# Altium footprint library wilamp_st_v1p00.PcbLib: 52 footprints (part 2 of 4)
Each footprint in its own frame and in the unit in brackets; x right, y up, seen from the top. Pads: shape width x height; smd on the part's side, far side on the other; paste and mask are expansions set on the pad; w line width, h text height; cw(c..) or ccw(c..) is an arc to the next point about the centre after c.
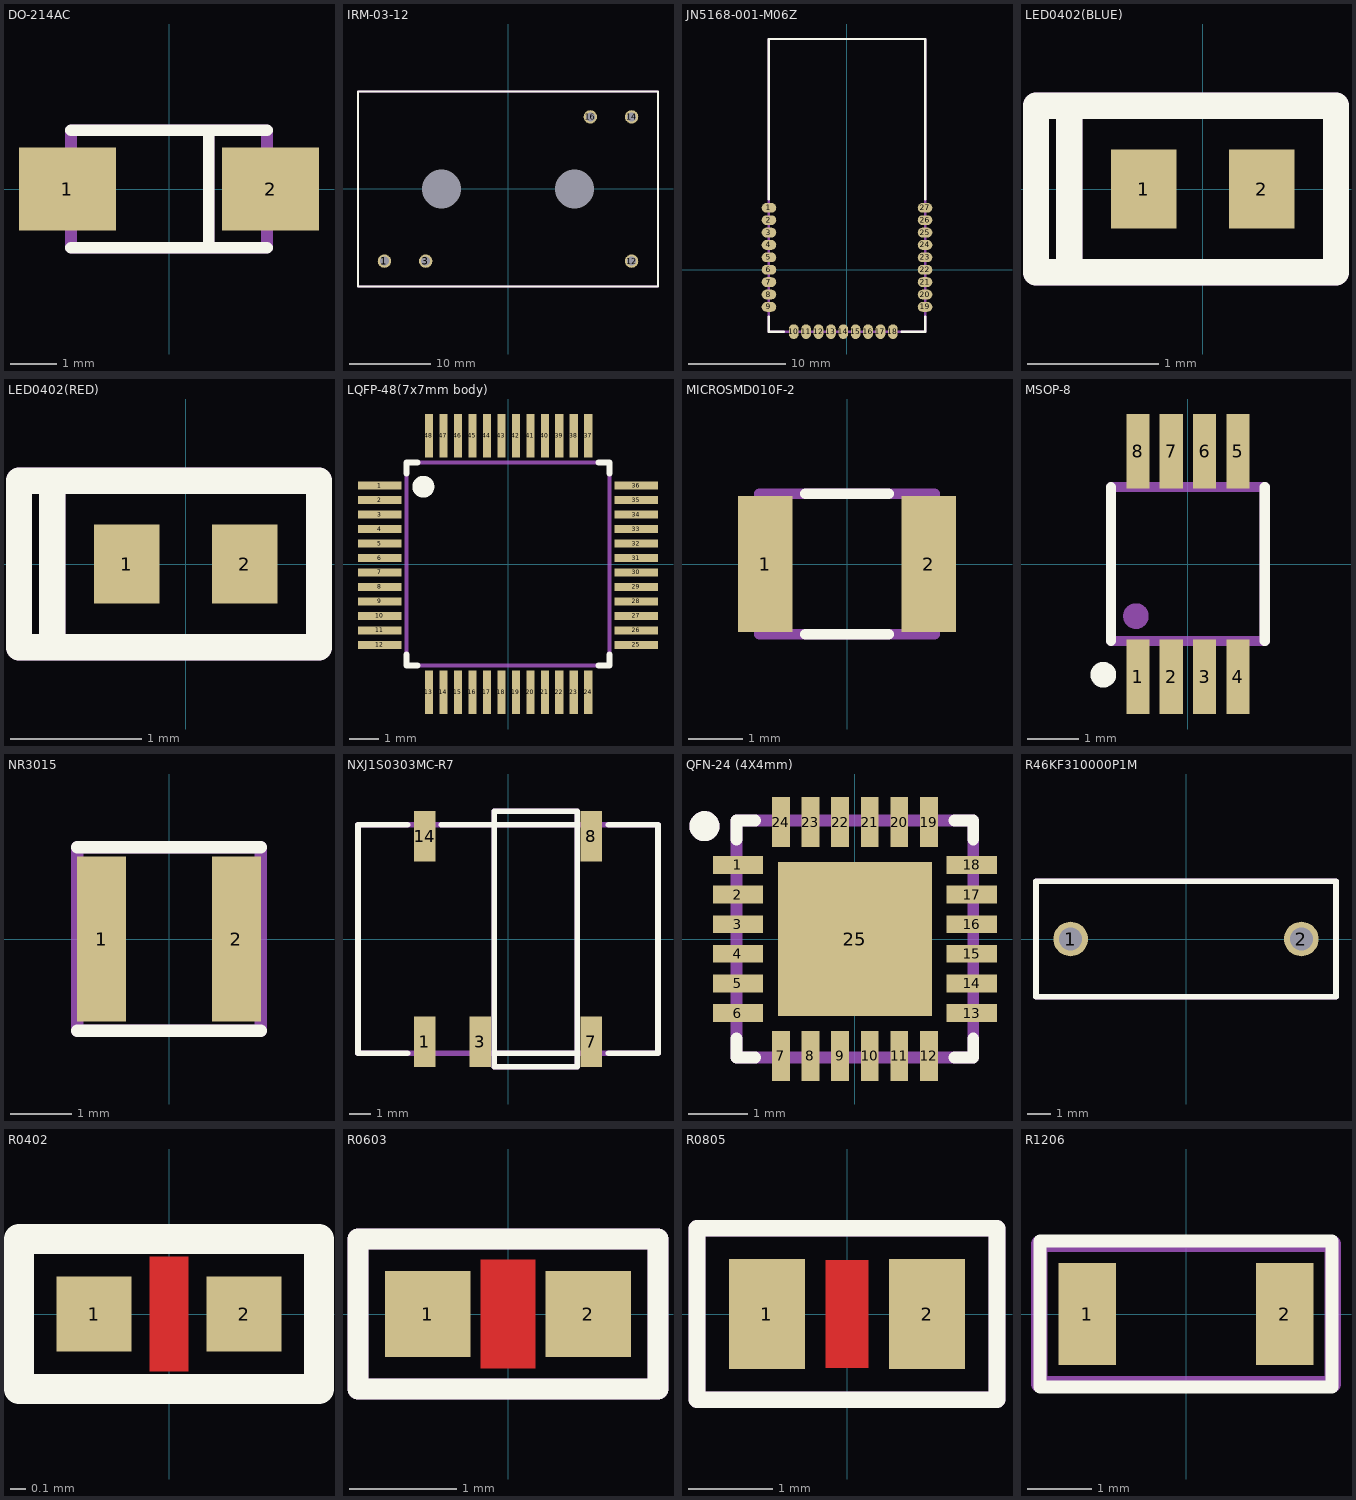
[diagram p1: the footprints below, top view; thin cyan lines are the x and y axes]

## DO-214AC [mm]
pads (2):
  rect 2.1x1.8 smd: 1(-2.2,0) 2(2.2,0)
Top Overlay:
  lines w0.254: -2.125,-1.27 2.125,-1.27 ; -2.125,1.27 2.125,1.27 ; 0.864,-1.252 0.864,1.25
Mechanical 16:
  lines w0.254: -2.125,-1.27 2.125,-1.27 2.125,1.27 -2.125,1.27 -2.125,-1.232 ; 0.864,-1.252 0.864,1.25
Mechanical 29:
  text ".Designator" at 0.191,0.531 h1
3D body "SW3dPS-DO-214AC SMA.STEP": height 2.4, standoff 0, extent -2.651,-1.321 2.549,1.279

## IRM-03-12 [mm]
pads (7):
  round 1.65 hole 1.1: 1(-15.24,-8.89) 3(-10.16,-8.89) 12(15.24,-8.89) 14(15.24,8.89) 16(10.16,8.89)
  round 0 hole 4.8 unplated: Hole(-8.22,0) Hole(8.22,0)
Top Overlay:
  lines w0.254: -18.5,-12 -18.5,12 18.5,12 18.5,-12 -18.5,-12
Mechanical 16:
  lines w0.254: -18.5,-12 -18.5,12 18.5,12 18.5,-12 -18.5,-12
Mechanical 29:
  text ".Designator" at 0.404,-5.89 h3
3D body: height 15, standoff 0, extent -18.5,-12 18.5,12

## JN5168-001-M06Z [mm]
pads (27):
  oval 1.5x1 smd: 1(-8,6.35) 2(-8,5.08) 3(-8,3.81) 4(-8,2.54) 5(-8,1.27) 6(-8,0) 7(-8,-1.27) 8(-8,-2.54) 9(-8,-3.81) 19(8,-3.81) 20(8,-2.54) 21(8,-1.27) 22(8,0) 23(8,1.27) 24(8,2.54) 25(8,3.81) 26(8,5.08) 27(8,6.35)
  oval 1x1.5 smd: 10(-5.46,-6.35) 11(-4.19,-6.35) 12(-2.92,-6.35) 13(-1.65,-6.35) 14(-0.38,-6.35) 15(0.89,-6.35) 16(2.16,-6.35) 17(3.43,-6.35) 18(4.7,-6.35)
Top Overlay:
  lines w0.254: -8,-4.827 -8,-6.35 -6.477,-6.35 ; -8,7.24 -8,23.65 8,23.65 8,7.24 ; 5.588,-6.35 8,-6.35 8,-4.827
Mechanical 16:
  lines w0.254: -8,-6.35 8,-6.35 8,23.65 -8,23.65 -8,-6.35
Mechanical 29:
  text ".Designator" at 0.705,5.946 h1.52
3D body: height 3.5, standoff 0, extent -8,-6.35 8,23.65

## LED0402(BLUE) [mm]
pads (2):
  rect 0.5x0.6 smd: 1(-0.45,0) 2(0.45,0)
Top Overlay:
  lines w0.2: -1.016,-0.635 -1.27,-0.635 -1.27,0.635 -1.016,0.635 ; -1.016,-0.635 -1.016,0.635 ; -1.016,-0.635 1.016,-0.635 1.016,0.635 -1.016,0.635
Mechanical 16:
  lines w0.2: -1.016,-0.635 -1.27,-0.635 -1.27,0.635 -1.016,0.635 ; -1.016,-0.635 -1.016,0.635 ; -1.016,-0.635 1.016,-0.635 1.016,0.635 -1.016,0.635
Mechanical 29:
  text ".Designator" at 0.58,0.232 h0.5
3D body "User Library-LED_1006_B.STEP": height 0.2, standoff 0, extent -0.5,-0.3 0.5,0.3

## LED0402(RED) [mm]
pads (2):
  rect 0.5x0.6 smd: 1(-0.45,0) 2(0.45,0)
Top Overlay:
  lines w0.2: -1.016,-0.635 1.016,-0.635 1.016,0.635 -1.016,0.635 ; -1.016,-0.635 -1.016,0.635 ; -1.016,-0.635 -1.27,-0.635 -1.27,0.635 -1.016,0.635
Mechanical 16:
  lines w0.2: -1.016,-0.635 1.016,-0.635 1.016,0.635 -1.016,0.635 ; -1.016,-0.635 -1.016,0.635 ; -1.016,-0.635 -1.27,-0.635 -1.27,0.635 -1.016,0.635
Mechanical 29:
  text ".Designator" at -0.635,-0.254 h0.5
3D body "User Library-led_0402.step": height 0.45, standoff 0, extent -0.505,-0.25 0.505,0.25

## LQFP-48(7x7mm body) [mm]
pads (48):
  rect 1.5x0.28 smd: 1(-4.425,2.707) 2(-4.425,2.207) 3(-4.425,1.707) 4(-4.425,1.207) 5(-4.425,0.707) 6(-4.425,0.207) 7(-4.425,-0.293) 8(-4.425,-0.793) 9(-4.425,-1.293) 10(-4.425,-1.793) 11(-4.425,-2.293) 12(-4.425,-2.793) 25(4.425,-2.793) 26(4.425,-2.293) 27(4.425,-1.793) 28(4.425,-1.293) 29(4.425,-0.793) 30(4.425,-0.293) 31(4.425,0.207) 32(4.425,0.707) 33(4.425,1.207) 34(4.425,1.707) 35(4.425,2.207) 36(4.425,2.707)
  rect 0.28x1.5 smd: 13(-2.73,-4.425) 14(-2.23,-4.425) 15(-1.73,-4.425) 16(-1.23,-4.425) 17(-0.73,-4.425) 18(-0.23,-4.425) 19(0.27,-4.425) 20(0.77,-4.425) 21(1.27,-4.425) 22(1.77,-4.425) 23(2.27,-4.425) 24(2.77,-4.425) 37(2.77,4.425) 38(2.27,4.425) 39(1.77,4.425) 40(1.27,4.425) 41(0.77,4.425) 42(0.27,4.425) 43(-0.23,4.425) 44(-0.73,4.425) 45(-1.23,4.425) 46(-1.73,4.425) 47(-2.23,4.425) 48(-2.73,4.425)
Top Overlay:
  circle w0.5: c-2.921,2.667 r0.127
  lines w0.2: -3.5,-3.119 -3.5,-3.5 -3.119,-3.5 ; -3.5,3.119 -3.5,3.5 -3.119,3.5 ; 3.119,-3.5 3.5,-3.5 3.5,-3.119 ; 3.119,3.5 3.5,3.5 3.5,3.119
Mechanical 16:
  lines w0.15: -3.5,-3.5 3.5,-3.5 ; -3.5,-3.5 -3.5,3.5 ; -3.5,-3.5 3.5,-3.5 ; -3.5,-3.5 -3.5,3.5 ; -3.5,3.5 3.5,3.5 ; -3.5,3.5 3.5,3.5 ; 3.5,-3.5 3.5,3.5 ; 3.5,-3.5 3.5,3.5
Mechanical 29:
  text ".Designator" at -0.454,0.404 h0.6
3D body "User Library-LQFP48.step": height 1.5, standoff 0, extent -4.5,-4.5 4.5,4.5

## MICROSMD010F-2 [mm]
pads (2):
  rect 1x2.5 smd: 1(-1.5,0) 2(1.5,0)
Top Overlay:
  lines w0.2: -0.762,-1.288 0.762,-1.288 ; -0.762,1.288 0.762,1.288
Mechanical 16:
  lines w0.2: -1.607,-1.288 -1.607,1.288 1.607,1.288 1.607,-1.288 -1.607,-1.288
Mechanical 29:
  text ".Designator" at 0.353,-0.978 h0.46
3D body: height 0.67, standoff 0, extent -1.607,-1.288 1.607,1.288

## MSOP-8 [mm]
pads (8):
  rect 0.45x1.45 smd: 1(-0.975,-2.2) 2(-0.325,-2.2) 3(0.325,-2.2) 4(0.975,-2.2) 5(0.975,2.2) 6(0.325,2.2) 7(-0.325,2.2) 8(-0.975,2.2)
Top Overlay:
  circle w0.25: c-1.649,-2.159 r0.125
  lines w0.2: -1.5,-1.5 -1.5,1.5 ; 1.5,-1.5 1.5,1.5
Mechanical 16:
  circle w0.25: c-1.014,-1.016 r0.125
  lines w0.2: -1.5,-1.5 1.5,-1.5 1.5,1.5 -1.5,1.5 -1.5,-1.5
Mechanical 29:
  text ".Designator" at 0.427,-0.876 h0.51
3D body "MSOP-8.STEP": height 1.15, standoff 0, extent -1.523,-2.419 1.477,2.481

## NR3015 [mm]
pads (2):
  rect 0.8x2.7 smd: 1(-1.1,0) 2(1.1,0)
Top Overlay:
  lines w0.2: -1.5,-1.5 1.5,-1.5 ; -1.5,1.5 1.5,1.5
Mechanical 16:
  lines w0.2: -1.5,-1.5 1.5,-1.5 1.5,1.5 -1.5,1.5 -1.5,-1.5
Mechanical 29:
  text ".Designator" at 1.038,0.198 h0.64
3D body: height 1.5, standoff 0, extent -1.5,-1.5 1.5,1.5

## NXJ1S0303MC-R7 [mm]
pads (5):
  rect 1x2.3 smd: 1(-3.81,-4.7) 3(-1.27,-4.7) 7(3.81,-4.7) 8(3.81,4.7) 14(-3.81,4.7)
Top Overlay:
  lines w0.254: -4.595,-5.23 -6.86,-5.23 -6.86,5.23 -4.595,5.23 ; -3.048,5.23 3.048,5.23 ; -0.508,-5.23 3.048,-5.23 ; 4.595,-5.23 6.86,-5.23 6.86,5.23 4.595,5.23 ; -0.635,-5.842 3.175,-5.842 3.175,5.842 -0.635,5.842 -0.635,-5.842
Mechanical 16:
  lines w0.254: -6.86,-5.23 -6.86,5.23 6.86,5.23 6.86,-5.23 -6.86,-5.23 ; -0.635,-5.842 3.175,-5.842 3.175,5.842 -0.635,5.842 -0.635,-5.842
Mechanical 29:
  text ".Designator" at -5.944,3.734 h3
3D body "mps_dcdc_nxj_a.step": height 4.22, standoff 0, extent -6.858,-5.232 6.858,5.233

## QFN-24 (4X4mm) [mm]
pads (25):
  rect 0.85x0.3 smd: 1(-1.975,1.25) 2(-1.975,0.75) 3(-1.975,0.25) 4(-1.975,-0.25) 5(-1.975,-0.75) 6(-1.975,-1.25) 13(1.975,-1.25) 14(1.975,-0.75) 15(1.975,-0.25) 16(1.975,0.25) 17(1.975,0.75) 18(1.975,1.25)
  rect 0.3x0.85 smd: 7(-1.25,-1.975) 8(-0.75,-1.975) 9(-0.25,-1.975) 10(0.25,-1.975) 11(0.75,-1.975) 12(1.25,-1.975) 19(1.25,1.975) 20(0.75,1.975) 21(0.25,1.975) 22(-0.25,1.975) 23(-0.75,1.975) 24(-1.25,1.975)
  rect 2.6x2.6 smd: 25(0,0)
Top Overlay:
  circle w0.254: c-2.54,1.905 r0.127
  lines w0.2: -2,-1.683 -2,-2 -1.683,-2 ; -2,1.683 -2,2 -1.683,2 ; 1.683,-2 2,-2 2,-1.683 ; 1.683,2 2,2 2,1.683
Mechanical 16:
  circle w0.254: c-2.54,1.905 r0.127
  lines w0.2: -2,-2 -2,2 2,2 2,-2 -2,-2
Mechanical 29:
  text ".Designator" at 0.594,-1.216 h1.5
3D body "User Library-QFN24-0_5.STEP": height 1, standoff 0, extent -2,-2 2,2

## R46KF310000P1M [mm]
pads (2):
  round 1.5 hole 1: 1(-5,0) 2(5,0)
Top Overlay:
  lines w0.254: -6.5,-2.5 -6.5,2.5 6.5,2.5 6.5,-2.5 -6.5,-2.5
Mechanical 16:
  lines w0.254: -6.5,-2.5 -6.5,2.5 6.5,2.5 6.5,-2.5 -6.5,-2.5
Mechanical 29:
  text ".Designator" at 3.046,0.912 h2
3D body: height 11, standoff 0, extent -6.5,-2.5 6.5,2.5

## R0402 [mm]
pads (2):
  rect 0.5x0.5 smd: 1(-0.5,0) 2(0.5,0)
Top Layer:
  pour cut-out: -0.127,0.381 0.127,0.381 0.127,-0.381 -0.127,-0.381
Top Overlay:
  lines w0.2: -1,-0.5 1,-0.5 1,0.5 -1,0.5 -1,-0.5
Mechanical 16:
  lines w0.15: -1,-0.5 1,-0.5 ; -1,-0.5 -1,0.5 ; -1,-0.5 1,-0.5 ; -1,-0.5 -1,0.5 ; -1,0.5 1,0.5 ; -1,0.5 1,0.5 ; 1,-0.5 1,0.5 ; 1,-0.5 1,0.5
Mechanical 29:
  text ".Designator" at 0.876,0.181 h0.4
3D body "R0402.step": height 0.4, standoff 0, extent -0.5,-0.25 0.5,0.25

## R0603 [mm]
pads (2):
  rect 0.8x0.8 smd: 1(-0.75,0) 2(0.75,0)
Top Layer:
  pour cut-out: -0.254,0.508 0.254,0.508 0.254,-0.508 -0.254,-0.508
Top Overlay:
  lines w0.2: -1.4,-0.7 1.4,-0.7 1.4,0.7 -1.4,0.7 -1.4,-0.7
Mechanical 16:
  lines w0.15: 1.4,-0.7 1.4,0.7
  lines w0.2: -1.4,-0.7 -1.4,0.7 1.4,0.7 1.4,-0.7 -1.4,-0.7
Mechanical 29:
  text ".Designator" at -0.762,-0.254 h0.6
3D body "User Library-RESC1608X05N.STEP": height 0.45, standoff 0, extent -0.775,-0.425 0.775,0.425

## R0805 [mm]
pads (2):
  rect 0.9x1.3 smd: 1(-0.95,0) 2(0.95,0)
Top Layer:
  pour cut-out: 0.254,0.635 -0.254,0.635 -0.254,-0.635 0.254,-0.635
Top Overlay:
  lines w0.2: -1.778,-1.016 1.778,-1.016 1.778,1.016 -1.778,1.016 -1.778,-1.016
Mechanical 16:
  lines w0.2: -1.778,-1.016 -1.778,1.016 1.778,1.016 1.778,-1.016 -1.778,-1.016
Mechanical 29:
  text ".Designator" at -0.635,-0.254 h0.6
3D body "User Library-RES_2013-0805.step": height 0.76, standoff 0, extent -1.15,-0.675 1.15,0.675

## R1206 [mm]
pads (2):
  rect 0.9x1.6 smd: 1(-1.55,0) 2(1.55,0)
Top Overlay:
  lines w0.2: -2.286,-1.143 2.286,-1.143 2.286,1.143 -2.286,1.143 -2.286,-1.143
Mechanical 16:
  lines w0.254: -2.3,-1.1 -2.3,1.1 ; -2.3,-1.1 2.3,-1.1 ; -2.3,-1.1 2.3,-1.1 ; -2.3,-1.1 -2.3,1.1 ; -2.3,1.1 2.3,1.1 ; -2.3,1.1 2.3,1.1 ; 2.3,-1.1 2.3,1.1 ; 2.3,-1.1 2.3,1.1
Mechanical 29:
  text ".Designator" at 0.94,0.533 h1
3D body "User Library-RES_3216-1206.step": height 0.85, standoff 0, extent -1.675,-0.865 1.675,0.865